# Altium footprint library PcbLib.PcbLib: 87 footprints (part 3 of 6)
Each footprint in its own frame and in the unit in brackets; x right, y up, seen from the top. Pads: shape width x height; smd on the part's side, far side on the other; paste and mask are expansions set on the pad; w line width, h text height; cw(c..) or ccw(c..) is an arc to the next point about the centre after c.
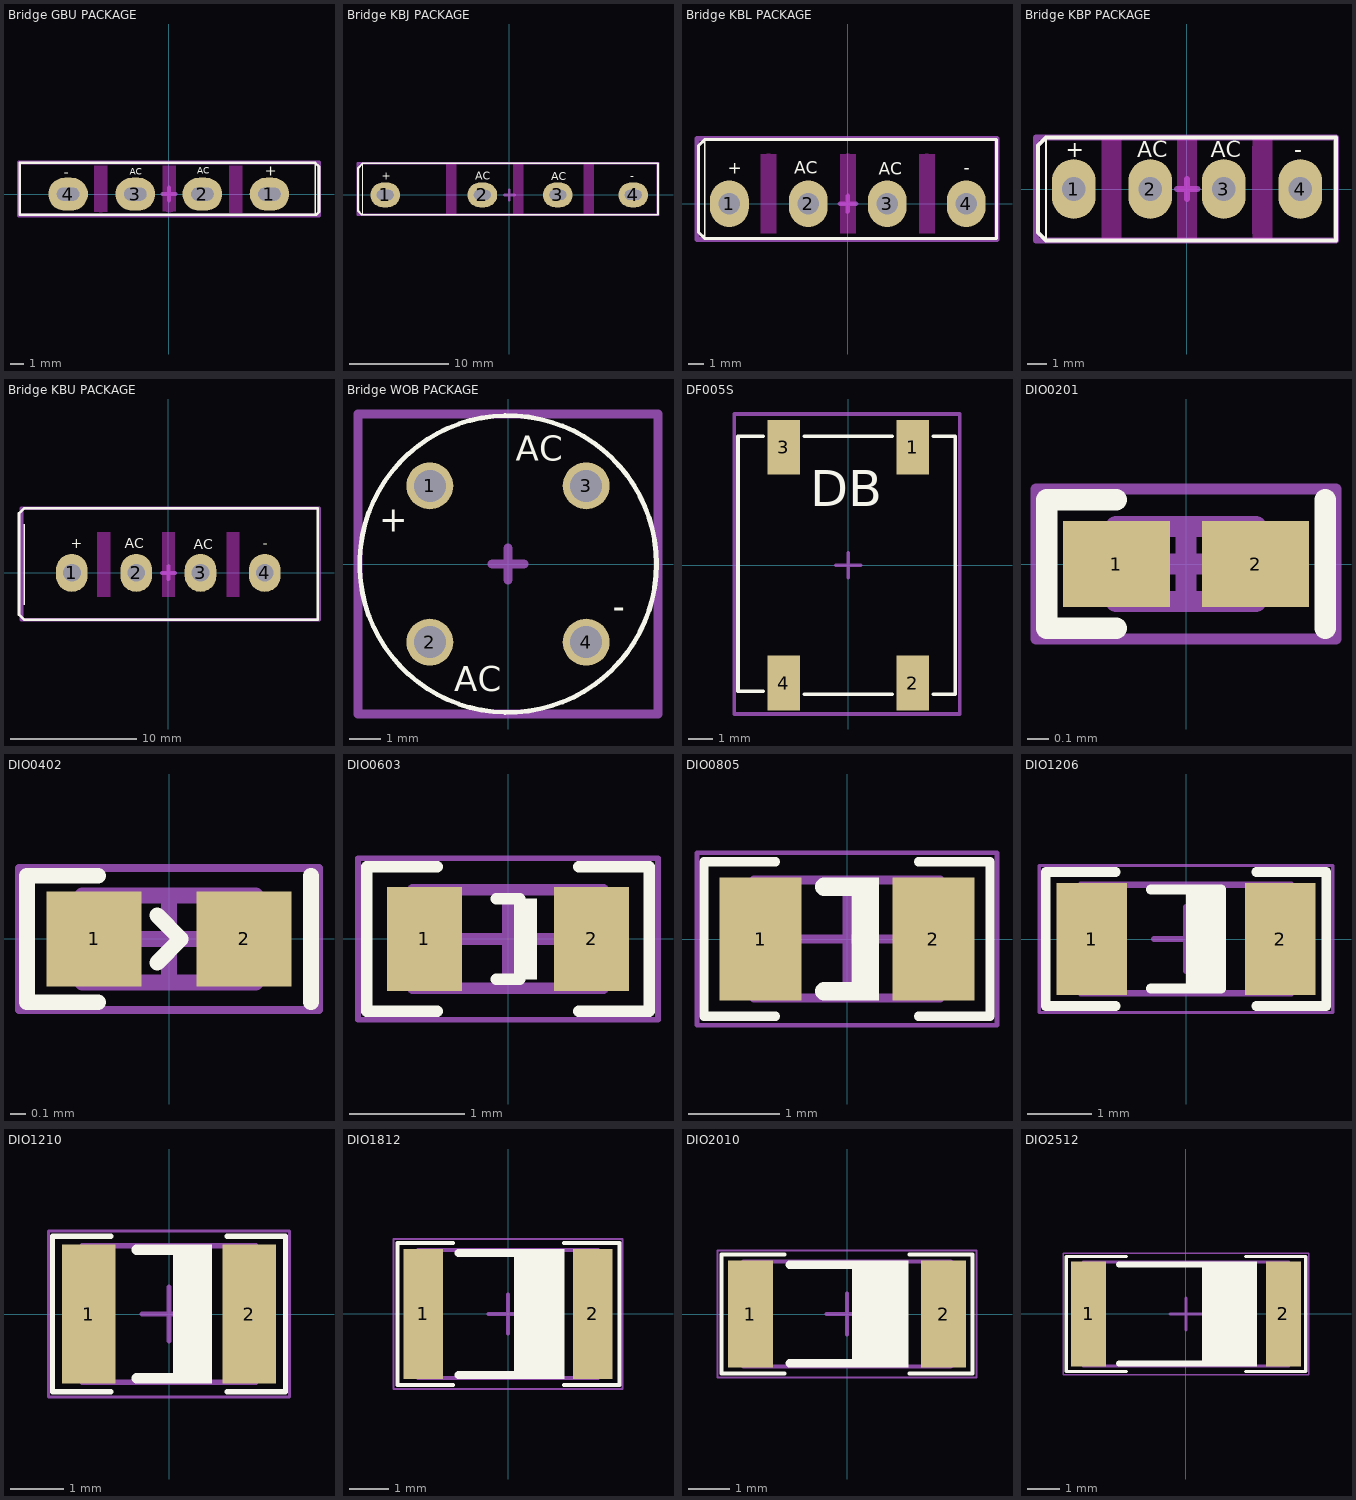
[diagram p2: the footprints below, top view; thin cyan lines are the x and y axes]

## Bridge GBU PACKAGE [mm] "GBU Bridge Rectifiers DESIGNER :ABBAS BASEREH"
height 30
pads (4):
  oval 3x2.5 hole 1 slot 1.7 at 0 deg: 1(7.62,0) 2(2.54,0) 3(-2.54,0) 4(-7.63,0)
Top Overlay:
  lines w0.1: 11.075,-1.575 11.075,2.375
  lines w0.2: -11.3,-1.575 11.15,-1.575 11.375,-1.35 11.375,2.075 11.075,2.375 -11.3,2.375 -11.3,-1.575
  text "AC" at 2.15,1.525 h0.5
  text "-" at -7.975,1.275 h0.8
  text "+" at 7.275,1.375 h0.8
  text "AC" at -2.95,1.475 h0.5
Keep-Out Layer:
  board cut-out: 4.575,2.15 5.575,2.15 5.575,-1.425 4.575,-1.425
  board cut-out: -0.475,2.15 0.525,2.15 0.525,-1.3 -0.475,-1.3
  board cut-out: -5.65,2.15 -4.65,2.15 -4.65,-1.35 -5.65,-1.35
Keep-Out Layer:
  lines w1: -5.15,-0.9 -5.15,1.65 ; 0.025,-0.875 0.025,1.65 ; 5.05,-0.925 5.05,1.65
Mechanical 15:
  lines w0.3: -0.5,0 0.525,0 ; 0,-0.5 0,0.5 ; -11.35,-1.625 -11.35,2.4 11.375,2.4 11.375,-1.625 -11.35,-1.625
3D body "User Library-GBU.STEP": height 21.83, standoff -2.5, extent -11.125,-1.41 11.175,2.15

## Bridge KBJ PACKAGE [mm] "KBJ Bridge Rectifiers DESIGNER :ABBAS BASEREH"
height 35
pads (4):
  oval 3x2.5 hole 1 slot 1.7 at 0 deg: 1(-12.525,0) 2(-2.715,0) 3(4.905,0) 4(12.525,0)
Top Overlay:
  lines w0.1: -14.775,-2 -14.775,3.1
  lines w0.2: -15.275,-1.6 -14.875,-2 15.025,-2 15.025,3.2 -14.775,3.2 -15.275,2.7 -15.275,-1.6
  text "+" at -12.875,1.525 h0.8
  text "-" at 12.225,1.525 h0.8
  text "AC" at 4.225,1.5 h0.8
  text "AC" at -3.408,1.525 h0.8
Keep-Out Layer:
  board cut-out: -6.375,3.2 -5.375,3.2 -5.375,-1.9 -6.375,-1.9
  board cut-out: 0.425,3.1 1.425,3.1 1.425,-2 0.425,-2
  board cut-out: 7.55,3.1 8.55,3.1 8.55,-2 7.55,-2
Keep-Out Layer:
  lines w1: -5.875,-1.425 -5.875,2.725 ; 0.925,-1.525 0.925,2.625 ; 8.025,-1.525 8.025,2.625
Mechanical 15:
  lines w0.3: -0.5,0 0.525,0 ; 0,-0.5 0,0.5 ; -15.275,-2 15.025,-2 15.025,3.2 -15.275,3.2 -15.275,-2
3D body "User Library-KBJ-GSIB.STEP": height 31.25, standoff -7.71, extent -15.071,-1.8 14.925,3

## Bridge KBL PACKAGE [mm] "KBL Bridge Rectifiers DESIGNER :ABBAS BASEREH"
height 15
pads (4):
  oval 2.5x3 hole 1.4: 1(-7.62,0) 2(-2.54,0) 3(2.54,0) 4(7.62,0)
Top Overlay:
  lines w0.1: -9.2,-2.225 -9.2,4.125
  lines w0.2: -9.612,-1.813 -9.2,-2.225 9.563,-2.225 9.563,4.125 -9.2,4.125 -9.612,3.713 -9.612,-1.813
  text "+" at -7.725,1.925 h0.8
  text "-" at 7.475,1.925 h0.8
  text "AC" at 2,1.875 h0.8
  text "AC" at -3.45,1.925 h0.8
Keep-Out Layer:
  board cut-out: -5.6,3.2 -4.6,3.2 -4.6,-1.9 -5.6,-1.9
  board cut-out: -0.5,3.2 0.5,3.2 0.5,-1.9 -0.5,-1.9
  board cut-out: 4.6,3.2 5.6,3.2 5.6,-1.9 4.6,-1.9
Keep-Out Layer:
  lines w1: -5.1,-1.425 -5.1,2.725 ; 0,-1.425 0,2.725 ; 5.075,-1.425 5.075,2.725
Mechanical 15:
  lines w0.3: -0.5,0 0.525,0 ; 0,-0.5 0,0.5 ; -9.7,-2.3 9.6,-2.3 9.6,4.2 -9.7,4.2 -9.7,-2.3
3D body "User Library-KBL-1.STEP": height 16.05, standoff -4.2, extent -9.512,-2.125 9.488,4.126

## Bridge KBP PACKAGE [mm] "KBP Bridge Rectifiers DESIGNER :ABBAS BASEREH"
height 10
pads (4):
  oval 2.2x3 hole 1.2: 1(-5.7,0) 2(-1.85,0) 3(1.85,0) 4(5.7,0)
Top Overlay:
  lines w0.1: -7.1,-2.55 -7.1,2.6
  lines w0.2: -7.5,-2.2 -7.5,2.2 -7.1,2.6 7.5,2.6 7.5,-2.6 -7.1,-2.6 -7.5,-2.2
  text "AC" at -2.5,1.6 h0.8
  text "AC" at 1.2,1.6 h0.8
  text "-" at 5.4,1.6 h0.8
  text "+" at -6.1,1.6 h0.8
Keep-Out Layer:
  board cut-out: 3.3,2.5 4.3,2.5 4.3,-2.6 3.3,-2.6
  board cut-out: -0.5,2.5 0.5,2.5 0.5,-2.6 -0.5,-2.6
  board cut-out: -4.3,2.5 -3.3,2.5 -3.3,-2.6 -4.3,-2.6
Keep-Out Layer:
  lines w1: -3.8,-2.125 -3.8,2.025 ; 0,-2.125 0,2.025 ; 3.775,-2.125 3.775,2.025
Mechanical 15:
  lines w0.3: -0.5,0 0.525,0 ; 0,-0.5 0,0.5 ; -7.6,-2.6 -7.6,2.6 7.5,2.6 7.5,-2.6 -7.6,-2.6
3D body "User Library-KBP.STEP": height 12.49, standoff -3.2, extent -7.377,-2.415 7.353,2.41

## Bridge KBU PACKAGE [mm] "KBU Bridge Rectifiers DESIGNER :ABBAS BASEREH"
height 18
pads (4):
  oval 2.5x3 hole 1.4: 1(-7.62,0) 2(-2.54,0) 3(2.54,0) 4(7.62,0)
Top Overlay:
  lines w0.1: -11.4,-2.5 -11.4,3.85
  lines w0.2: -11.8,-3.3 -11.8,4.7 -11.4,5.1 11.8,5.1 11.8,-3.7 -11.4,-3.7 -11.8,-3.3
  text "AC" at -3.45,1.925 h0.8
  text "AC" at 2,1.875 h0.8
  text "-" at 7.475,1.925 h0.8
  text "+" at -7.725,1.925 h0.8
Keep-Out Layer:
  board cut-out: 4.6,3.2 5.6,3.2 5.6,-1.9 4.6,-1.9
  board cut-out: -0.5,3.2 0.5,3.2 0.5,-1.9 -0.5,-1.9
  board cut-out: -5.6,3.2 -4.6,3.2 -4.6,-1.9 -5.6,-1.9
Keep-Out Layer:
  lines w1: -5.1,-1.425 -5.1,2.725 ; 0,-1.425 0,2.725 ; 5.075,-1.425 5.075,2.725
Mechanical 15:
  lines w0.3: -0.5,0 0.525,0 ; 0,-0.5 0,0.5 ; -11.6,-3.7 -11.6,5.1 11.9,5.1 11.9,-3.7 -11.6,-3.7
3D body "User Library-KBU.STEP": height 19.6, standoff -4.2, extent -11.612,-3.55 11.588,4.95

## Bridge WOB PACKAGE [mm] "WOB Bridge Rectifiers DESIGNER :ABBAS BASEREH"
height 5.1
pads (4):
  round 1.5 / inner round 1.905 / far side round 1.905 hole 1.016: 1(-2.5,2.5) 2(-2.5,-2.5) 3(2.5,2.5) 4(2.5,-2.5)
Top Overlay:
  circle w0.15: c0,0 r4.75
  text "-" at 3.35,-1.75 h0.8
  text "+" at -4.125,1.025 h0.8
  text "AC" at -1.725,-4.075 h0.8
  text "AC" at 0.25,3.3 h0.8
Mechanical 15:
  lines w0.3: -0.5,0 0.5,0 ; 0,-0.5 0,0.5 ; -4.8,-4.8 -4.8,4.8 4.8,4.8 4.8,-4.8 -4.8,-4.8
3D body "User Library-WOB.STEP": height 5.9, standoff -3.2, extent -4.675,-4.675 4.625,4.625

## DF005S [mm] "MINIATURE GLASS PASSIVATED SINGLE-PHASE SURFACE MOUNT  BRIDGE RECTIFIER-Design:Abbas Basereh"
height 3.3
pads (4):
  rect 1.3x2.2 smd: 1(2.6,4.75) 2(2.6,-4.75) 3(-2.6,4.75) 4(-2.6,-4.75)
Top Overlay:
  lines w0.15: -3.429,-5.08 -4.445,-5.08 -4.445,5.207 -3.429,5.207 ; -1.778,-5.207 1.778,-5.207 ; -1.778,5.207 1.778,5.207 ; 3.429,-5.207 4.318,-5.207 4.318,5.207 3.429,5.207
  text "DB" at -1.524,1.905 h2.5
Mechanical 15:
  lines w0.15: -0.5,0 0.5,0 ; 0,-0.5 0,0.5 ; -4.6,-6 4.5,-6 4.5,6.1 -4.6,6.1 -4.6,-6
3D body "User Library-DFXXS.STEP": height 3.58, standoff 0.01, extent -4.315,-5.099 4.195,5.201

## DIO0201 [mm] "Chip Diode, 2-Leads, Body 0/60x0/30mm, IPC Medium Density DESIGNER:ABBAS BASEREH"
height 0.23
pads (2):
  rect 0.5x0.4 smd mask+0.04: 1(-0.325,0) 2(0.325,0)
Top Overlay:
  lines w0.1: -0.325,-0.3 -0.65,-0.3 -0.65,0.3 -0.325,0.3 ; 0.65,-0.3 0.65,0.3
Mechanical 13:
  lines w0.1: -0.325,-0.175 0.325,-0.175 0.325,0.175 -0.325,0.175 -0.325,-0.175
Mechanical 15:
  lines w0.05: -0.7,-0.35 0.7,-0.35 0.7,0.35 -0.7,0.35 -0.7,-0.35
  lines w0.1: -0.175,0 0.175,0 ; 0,-0.175 0,0.175
3D body "DIO0201.step": height 0.23, standoff 0, extent -0.325,-0.175 0.325,0.175

## DIO0402 [mm] "Chip Diode, 2-Leads, Body 1/00x0/50mm, IPC Medium Density DESIGNER:ABBAS BASEREH"
height 0.32
pads (2):
  rect 0.6x0.6 smd mask+0.06: 1(-0.475,0) 2(0.475,0)
Top Overlay:
  lines w0.1: -0.45,-0.4 -0.9,-0.4 -0.9,0.4 -0.45,0.4 ; -0.075,-0.15 0.075,0 -0.075,0.15 ; 0.9,-0.4 0.9,0.4
Mechanical 13:
  lines w0.1: -0.55,-0.275 0.55,-0.275 0.55,0.275 -0.55,0.275 -0.55,-0.275
Mechanical 15:
  lines w0.05: -0.95,-0.45 0.95,-0.45 0.95,0.45 -0.95,0.45 -0.95,-0.45
  lines w0.1: -0.275,0 0.275,0 ; 0,-0.275 0,0.275
3D body "DIO0402.step": height 0.32, standoff 0, extent -0.55,-0.275 0.55,0.275

## DIO0603 [mm] "Chip Diode, 2-Leads, Body 1/60x0/80mm, IPC Medium Density DESIGNER:ABBAS BASEREH"
height 0.4
pads (2):
  rect 0.65x0.9 smd: 1(-0.725,0) 2(0.725,0)
Top Overlay:
  rectangle: 0.05,-0.35 0.25,0.35
  lines w0.1: -0.612,-0.625 -1.225,-0.625 -1.225,0.625 -0.612,0.625 ; -0.1,-0.35 0.1,-0.35 ; -0.1,0.35 0.1,0.35 ; 0.612,-0.625 1.225,-0.625 1.225,0.625 0.612,0.625
Mechanical 13:
  lines w0.1: -0.825,-0.425 0.825,-0.425 0.825,0.425 -0.825,0.425 -0.825,-0.425
Mechanical 15:
  lines w0.05: -1.3,-0.7 1.3,-0.7 1.3,0.7 -1.3,0.7 -1.3,-0.7
  lines w0.1: -0.425,0 0.425,0 ; 0,-0.425 0,0.425
3D body "DIO0603.step": height 0.4, standoff 0, extent -0.825,-0.425 0.825,0.425

## DIO0805 [mm] "Chip Diode, 2-Leads, Body 2/00x1/25mm, IPC Medium Density DESIGNER:ABBAS BASEREH"
height 0.5
pads (2):
  rect 0.9x1.35 smd: 1(-0.95,0) 2(0.95,0)
Top Overlay:
  rectangle: 0.05,-0.675 0.35,0.675
  lines w0.1: -0.788,-0.85 -1.575,-0.85 -1.575,0.85 -0.788,0.85 ; 0.788,-0.85 1.575,-0.85 1.575,0.85 0.788,0.85
  lines w0.2: -0.25,-0.575 0.1,-0.575 ; -0.25,0.575 0.1,0.575
Mechanical 13:
  lines w0.1: -1.025,-0.65 -1.025,0.65 1.025,0.65 1.025,-0.65 -1.025,-0.65
Mechanical 15:
  lines w0.05: -1.65,-0.95 -1.65,0.95 1.65,0.95 1.65,-0.95 -1.65,-0.95
  lines w0.1: -0.5,0 0.5,0 ; 0,-0.5 0,0.5
3D body "DIO0805.step": height 0.5, standoff 0, extent -1.025,-0.65 1.025,0.65

## DIO1206 [mm] "Chip Diode, 2-Leads, Body 3/20x1/60mm, IPC Medium Density DESIGNER:ABBAS BASEREH"
height 0.94
pads (2):
  rect 1.1x1.75 smd: 1(-1.475,0) 2(1.475,0)
Top Overlay:
  rectangle: 0,-0.8 0.625,0.775
  lines w0.15: -1.1,-1.05 -2.2,-1.05 -2.2,1.05 -1.1,1.05 ; -0.55,-0.775 0.55,-0.775 ; -0.55,0.775 0.55,0.775 ; 1.1,-1.05 2.2,-1.05 2.2,1.05 1.1,1.05
Mechanical 13:
  lines w0.1: -1.65,-0.85 1.65,-0.85 1.65,0.85 -1.65,0.85 -1.65,-0.85
Mechanical 15:
  lines w0.05: -2.3,-1.15 2.3,-1.15 2.3,1.15 -2.3,1.15 -2.3,-1.15
  lines w0.1: -0.5,0 0.5,0 ; 0,-0.5 0,0.5
3D body "DIO1206.step": height 0.94, standoff 0, extent -1.65,-0.85 1.65,0.85

## DIO1210 [mm] "Chip Diode, 2-Leads, Body 3/20x2/50mm, IPC Medium Density DESIGNER:ABBAS BASEREH"
height 0.55
pads (2):
  rect 1x2.6 smd: 1(-1.5,0) 2(1.5,0)
Top Overlay:
  rectangle: 0.075,-1.3 0.8,1.3
  lines w0.1: -1.088,-1.45 -2.175,-1.45 -2.175,1.45 -1.088,1.45 ; 1.088,-1.45 2.175,-1.45 2.175,1.45 1.088,1.45
  lines w0.2: -0.6,-1.2 0.6,-1.2 ; -0.6,1.2 0.6,1.2
Mechanical 13:
  lines w0.1: -1.625,-1.275 -1.625,1.275 1.625,1.275 1.625,-1.275 -1.625,-1.275
Mechanical 15:
  lines w0.05: -2.25,-1.55 -2.25,1.55 2.25,1.55 2.25,-1.55 -2.25,-1.55
  lines w0.1: -0.5,0 0.5,0 ; 0,-0.5 0,0.5
3D body "DIO1210.step": height 0.55, standoff 0, extent -1.625,-1.275 1.625,1.275

## DIO1812 [mm] "Chip Diode, 2-Leads, Body 4/50x3/20mm, IPC Medium Density DESIGNER:ABBAS BASEREH"
height 0.55
pads (2):
  rect 1x3.3 smd: 1(-2.15,0) 2(2.15,0)
Top Overlay:
  rectangle: 0.15,-1.65 1.425,1.65
  lines w0.1: -1.394,-1.8 -2.8,-1.8 -2.8,1.8 -1.394,1.8 ; 1.419,-1.8 2.825,-1.8 2.825,1.8 1.419,1.8
  lines w0.2: -1.25,-1.55 1.25,-1.55 ; -1.25,1.55 1.25,1.55
Mechanical 13:
  lines w0.1: -2.275,-1.625 2.275,-1.625 2.275,1.625 -2.275,1.625 -2.275,-1.625
Mechanical 15:
  lines w0.05: -2.9,-1.9 2.9,-1.9 2.9,1.9 -2.9,1.9 -2.9,-1.9
  lines w0.1: -0.5,0 0.5,0 ; 0,-0.5 0,0.5
3D body "DIO1812.step": height 0.55, standoff 0, extent -2.275,-1.625 2.275,1.625

## DIO2010 [mm] "Chip Diode, 2-Leads, Body 5/00x2/50mm, IPC Medium Density DESIGNER:ABBAS BASEREH"
height 0.55
pads (2):
  rect 1.1x2.6 smd: 1(-2.35,0) 2(2.35,0)
Top Overlay:
  rectangle: 0.125,-1.3 1.5,1.3
  lines w0.1: -1.525,-1.45 -3.05,-1.45 -3.05,1.45 -1.525,1.45 ; 1.525,-1.45 3.05,-1.45 3.05,1.45 1.525,1.45
  lines w0.2: -1.4,-1.2 1.4,-1.2 ; -1.4,1.2 1.4,1.2
Mechanical 13:
  lines w0.1: -2.525,-1.275 -2.525,1.275 2.525,1.275 2.525,-1.275 -2.525,-1.275
Mechanical 15:
  lines w0.05: -3.15,-1.55 -3.15,1.55 3.15,1.55 3.15,-1.55 -3.15,-1.55
  lines w0.1: -0.5,0 0.5,0 ; 0,-0.5 0,0.5
3D body "DIO2010.step": height 0.55, standoff 0, extent -2.525,-1.275 2.525,1.275

## DIO2512 [mm] "Chip Diode, 2-Leads, Body 6/40x3/20mm, IPC Medium Density DESIGNER:ABBAS BASEREH"
height 0.7
pads (2):
  rect 1.1x3.3 smd: 1(-3.05,0) 2(3.05,0)
Top Overlay:
  rectangle: 0.5,-1.65 2.225,1.65
  lines w0.1: -1.875,-1.8 -3.75,-1.8 -3.75,1.8 -1.875,1.8 ; 1.875,-1.8 3.75,-1.8 3.75,1.8 1.875,1.8
  lines w0.2: -2.1,-1.55 2.1,-1.55 ; -2.1,1.55 2.1,1.55
Mechanical 13:
  lines w0.1: -3.225,-1.625 3.225,-1.625 3.225,1.625 -3.225,1.625 -3.225,-1.625
Mechanical 15:
  lines w0.05: -3.85,-1.9 3.85,-1.9 3.85,1.9 -3.85,1.9 -3.85,-1.9
  lines w0.1: -0.5,0 0.5,0 ; 0,-0.5 0,0.5
3D body "DIO2512.step": height 0.7, standoff 0, extent -3.225,-1.625 3.225,1.625